# Altium footprint library Connect.PcbLib: 272 footprints (part 10 of 17)
Each footprint in its own frame and in the unit in brackets; x right, y up, seen from the top. Pads: shape width x height; smd on the part's side, far side on the other; paste and mask are expansions set on the pad; w line width, h text height; cw(c..) or ccw(c..) is an arc to the next point about the centre after c.
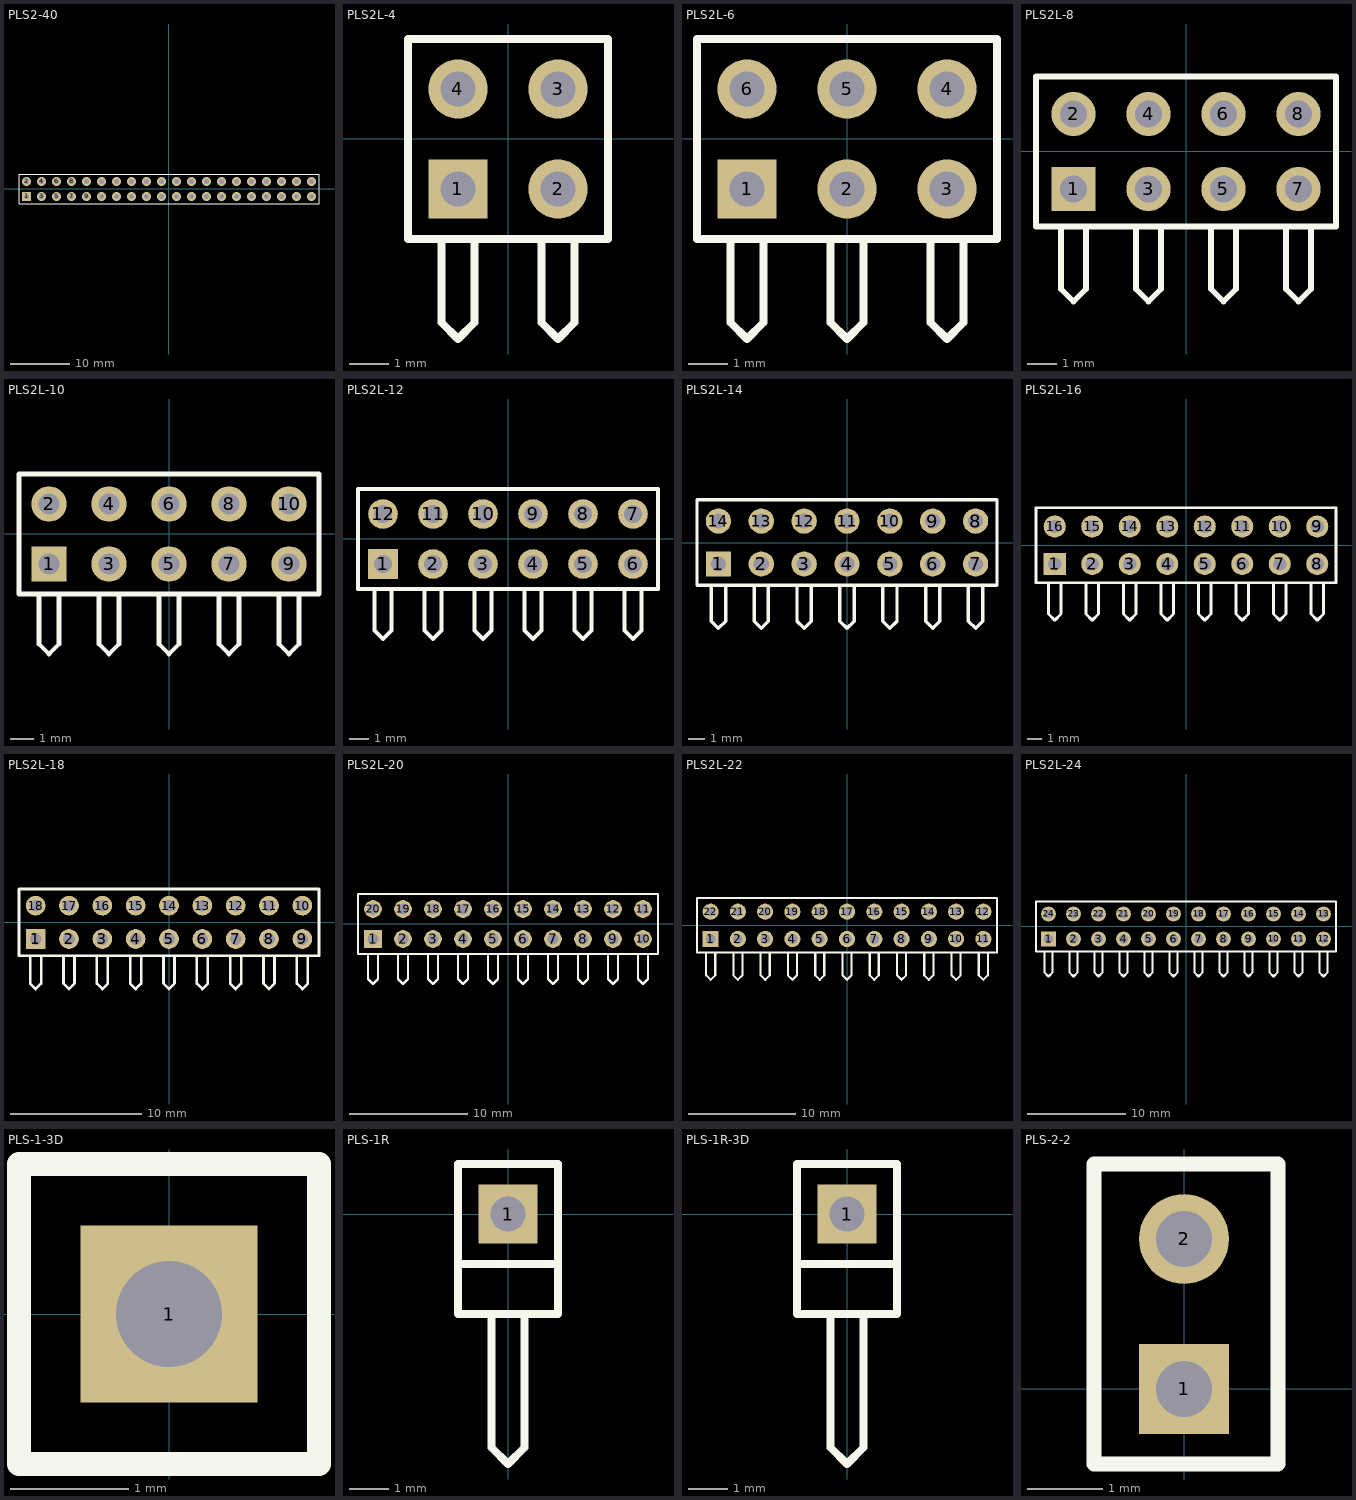
[diagram p9: the footprints below, top view; thin cyan lines are the x and y axes]

## PLS2-40 [mm] "Connector; Header; 40 Position"
height 7.5
pads (40):
  rect 1.5x1.5 hole 0.9: 1(-24.13,-1.27)
  round 1.5 hole 0.9: 2(-24.13,1.27) 3(-21.59,-1.27) 4(-21.59,1.27) 5(-19.05,-1.27) 6(-19.05,1.27) 7(-16.51,-1.27) 8(-16.51,1.27) 9(-13.97,-1.27) 10(-13.97,1.27) 11(-11.43,-1.27) 12(-11.43,1.27) 13(-8.89,-1.27) 14(-8.89,1.27) 15(-6.35,-1.27) 16(-6.35,1.27) 17(-3.81,-1.27) 18(-3.81,1.27) 19(-1.27,-1.27) 20(-1.27,1.27) 21(1.27,-1.27) 22(1.27,1.27) 23(3.81,-1.27) 24(3.81,1.27) 25(6.35,-1.27) 26(6.35,1.27) 27(8.89,-1.27) 28(8.89,1.27) 29(11.43,-1.27) 30(11.43,1.27) 31(13.97,-1.27) 32(13.97,1.27) 33(16.51,-1.27) 34(16.51,1.27) 35(19.05,-1.27) 36(19.05,1.27) 37(21.59,-1.27) 38(21.59,1.27) 39(24.13,-1.27) 40(24.13,1.27)
Top Overlay:
  lines w0.2: -25.4,-2.54 -25.4,2.54 25.4,2.54 25.4,-2.54 -25.4,-2.54
3D body "PLS-1.step": height 8.44, standoff -3, extent 22.86,0 25.4,2.54
3D body "PLS-1.step": height 8.44, standoff -3, extent 22.86,-2.54 25.4,0
3D body "PLS-1.step": height 8.44, standoff -3, extent 20.32,0 22.86,2.54
3D body "PLS-1.step": height 8.44, standoff -3, extent 20.32,-2.54 22.86,0
3D body "PLS-1.step": height 8.44, standoff -3, extent 17.78,-2.54 20.32,0
3D body "PLS-1.step": height 8.44, standoff -3, extent 17.78,0 20.32,2.54
3D body "PLS-1.step": height 8.44, standoff -3, extent 15.24,0 17.78,2.54
3D body "PLS-1.step": height 8.44, standoff -3, extent 15.24,-2.54 17.78,0
3D body "PLS-1.step": height 8.44, standoff -3, extent 12.7,-2.54 15.24,0
3D body "PLS-1.step": height 8.44, standoff -3, extent 12.7,0 15.24,2.54
3D body "PLS-1.step": height 8.44, standoff -3, extent 10.16,0 12.7,2.54
3D body "PLS-1.step": height 8.44, standoff -3, extent 10.16,-2.54 12.7,0
3D body "PLS-1.step": height 8.44, standoff -3, extent 7.62,0 10.16,2.54
3D body "PLS-1.step": height 8.44, standoff -3, extent 7.62,-2.54 10.16,0
3D body "PLS-1.step": height 8.44, standoff -3, extent 5.08,-2.54 7.62,0
3D body "PLS-1.step": height 8.44, standoff -3, extent 5.08,0 7.62,2.54
3D body "PLS-1.step": height 8.44, standoff -3, extent 2.54,0 5.08,2.54
3D body "PLS-1.step": height 8.44, standoff -3, extent 2.54,-2.54 5.08,0
3D body "PLS-1.step": height 8.44, standoff -3, extent 0,-2.54 2.54,0
3D body "PLS-1.step": height 8.44, standoff -3, extent 0,0 2.54,2.54
3D body "PLS-1.step": height 8.44, standoff -3, extent -5.08,-2.54 -2.54,0
3D body "PLS-1.step": height 8.44, standoff -3, extent -5.08,0 -2.54,2.54
3D body "PLS-1.step": height 8.44, standoff -3, extent -10.16,-2.54 -7.62,0
3D body "PLS-1.step": height 8.44, standoff -3, extent -10.16,0 -7.62,2.54
3D body "PLS-1.step": height 8.44, standoff -3, extent -15.24,-2.54 -12.7,0
3D body "PLS-1.step": height 8.44, standoff -3, extent -15.24,0 -12.7,2.54
3D body "PLS-1.step": height 8.44, standoff -3, extent -20.32,-2.54 -17.78,0
3D body "PLS-1.step": height 8.44, standoff -3, extent -20.32,0 -17.78,2.54
3D body "PLS-1.step": height 8.44, standoff -3, extent -22.86,0 -20.32,2.54
3D body "PLS-1.step": height 8.44, standoff -3, extent -25.4,0 -22.86,2.54
3D body "PLS-1.step": height 8.44, standoff -3, extent -22.86,-2.54 -20.32,0
3D body "PLS-1.step": height 8.44, standoff -3, extent -25.4,-2.54 -22.86,0
3D body "PLS-1.step": height 8.44, standoff -3, extent -17.78,0 -15.24,2.54
3D body "PLS-1.step": height 8.44, standoff -3, extent -17.78,-2.54 -15.24,0
3D body "PLS-1.step": height 8.44, standoff -3, extent -12.7,0 -10.16,2.54
3D body "PLS-1.step": height 8.44, standoff -3, extent -12.7,-2.54 -10.16,0
3D body "PLS-1.step": height 8.44, standoff -3, extent -7.62,0 -5.08,2.54
3D body "PLS-1.step": height 8.44, standoff -3, extent -7.62,-2.54 -5.08,0
3D body "PLS-1.step": height 8.44, standoff -3, extent -2.54,0 0,2.54
3D body "PLS-1.step": height 8.44, standoff -3, extent -2.54,-2.54 0,0

## PLS2L-4 [mm]
pads (4):
  rect 1.5x1.5 hole 0.9: 1(-1.27,-1.27)
  round 1.5 hole 0.9: 2(1.27,-1.27) 3(1.27,1.27) 4(-1.27,1.27)
Top Overlay:
  lines w0.2: -1.693,-2.54 -1.693,-4.657 -1.27,-5.08 -0.847,-4.657 -0.847,-2.54 ; 0.847,-2.54 0.847,-4.657 1.27,-5.08 1.693,-4.657 1.693,-2.54 ; -2.54,-2.54 2.54,-2.54 2.54,2.54 -2.54,2.54 -2.54,-2.54
3D body "2.54_horiz_1x2Lpin.STEP": height 4.95, standoff -2.93, extent -2.487,-11.138 -0.013,1.625
3D body "2.54_horiz_1x2Lpin.STEP": height 4.95, standoff -2.93, extent 0.013,-11.138 2.487,1.625

## PLS2L-6 [mm]
pads (6):
  rect 1.5x1.5 hole 0.9: 1(-2.54,-1.27)
  round 1.5 hole 0.9: 2(0,-1.27) 3(2.54,-1.27) 4(2.54,1.27) 5(0,1.27) 6(-2.54,1.27)
Top Overlay:
  lines w0.2: -2.963,-2.54 -2.963,-4.657 -2.54,-5.08 -2.117,-4.657 -2.117,-2.54 ; -0.423,-2.54 -0.423,-4.657 0,-5.08 0.423,-4.657 0.423,-2.54 ; 2.117,-2.54 2.117,-4.657 2.54,-5.08 2.963,-4.657 2.963,-2.54 ; -3.81,-2.54 3.81,-2.54 3.81,2.54 -3.81,2.54 -3.81,-2.54
3D body "2.54_horiz_1x2Lpin.STEP": height 4.95, standoff -2.93, extent 1.288,-11.138 3.762,1.625
3D body "2.54_horiz_1x2Lpin.STEP": height 4.95, standoff -2.93, extent -3.782,-11.138 -1.308,1.625
3D body "2.54_horiz_1x2Lpin.STEP": height 4.95, standoff -2.93, extent -1.232,-11.138 1.242,1.625

## PLS2L-8 [mm]
pads (8):
  rect 1.5x1.5 hole 0.9: 1(-3.81,-1.27)
  round 1.5 hole 0.9: 2(-3.81,1.27) 3(-1.27,-1.27) 4(-1.27,1.27) 5(1.27,-1.27) 6(1.27,1.27) 7(3.81,-1.27) 8(3.81,1.27)
Top Overlay:
  lines w0.2: -4.233,-2.54 -4.233,-4.657 -3.81,-5.08 -3.387,-4.657 -3.387,-2.54 ; -1.693,-2.54 -1.693,-4.657 -1.27,-5.08 -0.847,-4.657 -0.847,-2.54 ; 0.847,-2.54 0.847,-4.657 1.27,-5.08 1.693,-4.657 1.693,-2.54 ; 3.387,-2.54 3.387,-4.657 3.81,-5.08 4.233,-4.657 4.233,-2.54 ; -5.08,-2.54 -5.08,2.54 5.08,2.54 5.08,-2.54 -5.08,-2.54
3D body "2.54_horiz_1x2Lpin.STEP": height 4.95, standoff -2.93, extent -2.502,-11.138 -0.028,1.625
3D body "2.54_horiz_1x2Lpin.STEP": height 4.95, standoff -2.93, extent -5.052,-11.138 -2.578,1.625
3D body "2.54_horiz_1x2Lpin.STEP": height 4.95, standoff -2.93, extent 0.018,-11.138 2.492,1.625
3D body "2.54_horiz_1x2Lpin.STEP": height 4.95, standoff -2.93, extent 2.558,-11.138 5.032,1.625

## PLS2L-10 [mm]
pads (10):
  rect 1.5x1.5 hole 0.9: 1(-5.08,-1.27)
  round 1.5 hole 0.9: 2(-5.08,1.27) 3(-2.54,-1.27) 4(-2.54,1.27) 5(0,-1.27) 6(0,1.27) 7(2.54,-1.27) 8(2.54,1.27) 9(5.08,-1.27) 10(5.08,1.27)
Top Overlay:
  lines w0.2: -5.503,-2.54 -5.503,-4.657 -5.08,-5.08 -4.657,-4.657 -4.657,-2.54 ; -2.963,-2.54 -2.963,-4.657 -2.54,-5.08 -2.117,-4.657 -2.117,-2.54 ; -0.423,-2.54 -0.423,-4.657 0,-5.08 0.423,-4.657 0.423,-2.54 ; 2.117,-2.54 2.117,-4.657 2.54,-5.08 2.963,-4.657 2.963,-2.54 ; 4.657,-2.54 4.657,-4.657 5.08,-5.08 5.503,-4.657 5.503,-2.54 ; -6.35,-2.54 6.35,-2.54 6.35,2.54 -6.35,2.54 -6.35,-2.54
3D body "2.54_horiz_1x2Lpin.STEP": height 4.95, standoff -2.93, extent 3.828,-11.138 6.302,1.625
3D body "2.54_horiz_1x2Lpin.STEP": height 4.95, standoff -2.93, extent 1.288,-11.138 3.762,1.625
3D body "2.54_horiz_1x2Lpin.STEP": height 4.95, standoff -2.93, extent -1.252,-11.138 1.222,1.625
3D body "2.54_horiz_1x2Lpin.STEP": height 4.95, standoff -2.93, extent -6.322,-11.138 -3.848,1.625
3D body "2.54_horiz_1x2Lpin.STEP": height 4.95, standoff -2.93, extent -3.772,-11.138 -1.298,1.625

## PLS2L-12 [mm]
pads (12):
  rect 1.5x1.5 hole 0.9: 1(-6.35,-1.27)
  round 1.5 hole 0.9: 2(-3.81,-1.27) 3(-1.27,-1.27) 4(1.27,-1.27) 5(3.81,-1.27) 6(6.35,-1.27) 7(6.35,1.27) 8(3.81,1.27) 9(1.27,1.27) 10(-1.27,1.27) 11(-3.81,1.27) 12(-6.35,1.27)
Top Overlay:
  lines w0.2: -6.773,-2.54 -6.773,-4.657 -6.35,-5.08 -5.927,-4.657 -5.927,-2.54 ; -4.233,-2.54 -4.233,-4.657 -3.81,-5.08 -3.387,-4.657 -3.387,-2.54 ; -1.693,-2.54 -1.693,-4.657 -1.27,-5.08 -0.847,-4.657 -0.847,-2.54 ; 0.847,-2.54 0.847,-4.657 1.27,-5.08 1.693,-4.657 1.693,-2.54 ; 3.387,-2.54 3.387,-4.657 3.81,-5.08 4.233,-4.657 4.233,-2.54 ; 5.927,-2.54 5.927,-4.657 6.35,-5.08 6.773,-4.657 6.773,-2.54 ; -7.62,-2.54 -7.62,2.54 7.62,2.54 7.62,-2.54 -7.62,-2.54
3D body "2.54_horiz_1x2Lpin.STEP": height 4.95, standoff -2.93, extent 5.098,-11.138 7.572,1.625
3D body "2.54_horiz_1x2Lpin.STEP": height 4.95, standoff -2.93, extent -5.042,-11.138 -2.568,1.625
3D body "2.54_horiz_1x2Lpin.STEP": height 4.95, standoff -2.93, extent -7.592,-11.138 -5.118,1.625
3D body "2.54_horiz_1x2Lpin.STEP": height 4.95, standoff -2.93, extent -2.522,-11.138 -0.048,1.625
3D body "2.54_horiz_1x2Lpin.STEP": height 4.95, standoff -2.93, extent 0.018,-11.138 2.492,1.625
3D body "2.54_horiz_1x2Lpin.STEP": height 4.95, standoff -2.93, extent 2.558,-11.138 5.032,1.625

## PLS2L-14 [mm]
pads (14):
  rect 1.5x1.5 hole 0.9: 1(-7.62,-1.27)
  round 1.5 hole 0.9: 2(-5.08,-1.27) 3(-2.54,-1.27) 4(0,-1.27) 5(2.54,-1.27) 6(5.08,-1.27) 7(7.62,-1.27) 8(7.62,1.27) 9(5.08,1.27) 10(2.54,1.27) 11(0,1.27) 12(-2.54,1.27) 13(-5.08,1.27) 14(-7.62,1.27)
Top Overlay:
  lines w0.2: -8.043,-2.54 -8.043,-4.657 -7.62,-5.08 -7.197,-4.657 -7.197,-2.54 ; -5.503,-2.54 -5.503,-4.657 -5.08,-5.08 -4.657,-4.657 -4.657,-2.54 ; -2.963,-2.54 -2.963,-4.657 -2.54,-5.08 -2.117,-4.657 -2.117,-2.54 ; -0.423,-2.54 -0.423,-4.657 0,-5.08 0.423,-4.657 0.423,-2.54 ; 2.117,-2.54 2.117,-4.657 2.54,-5.08 2.963,-4.657 2.963,-2.54 ; 4.657,-2.54 4.657,-4.657 5.08,-5.08 5.503,-4.657 5.503,-2.54 ; 7.197,-2.54 7.197,-4.657 7.62,-5.08 8.043,-4.657 8.043,-2.54 ; -8.89,-2.54 -8.89,2.54 8.89,2.54 8.89,-2.54 -8.89,-2.54
3D body "2.54_horiz_1x2Lpin.STEP": height 4.95, standoff -2.93, extent 3.828,-11.138 6.302,1.625
3D body "2.54_horiz_1x2Lpin.STEP": height 4.95, standoff -2.93, extent -6.312,-11.138 -3.838,1.625
3D body "2.54_horiz_1x2Lpin.STEP": height 4.95, standoff -2.93, extent -8.862,-11.138 -6.388,1.625
3D body "2.54_horiz_1x2Lpin.STEP": height 4.95, standoff -2.93, extent -3.792,-11.138 -1.318,1.625
3D body "2.54_horiz_1x2Lpin.STEP": height 4.95, standoff -2.93, extent -1.252,-11.138 1.222,1.625
3D body "2.54_horiz_1x2Lpin.STEP": height 4.95, standoff -2.93, extent 1.288,-11.138 3.762,1.625
3D body "2.54_horiz_1x2Lpin.STEP": height 4.95, standoff -2.93, extent 6.368,-11.138 8.842,1.625

## PLS2L-16 [mm]
pads (16):
  rect 1.5x1.5 hole 0.9: 1(-8.89,-1.27)
  round 1.5 hole 0.9: 2(-6.35,-1.27) 3(-3.81,-1.27) 4(-1.27,-1.27) 5(1.27,-1.27) 6(3.81,-1.27) 7(6.35,-1.27) 8(8.89,-1.27) 9(8.89,1.27) 10(6.35,1.27) 11(3.81,1.27) 12(1.27,1.27) 13(-1.27,1.27) 14(-3.81,1.27) 15(-6.35,1.27) 16(-8.89,1.27)
Top Overlay:
  lines w0.2: -9.313,-2.54 -9.313,-4.657 -8.89,-5.08 -8.467,-4.657 -8.467,-2.54 ; -6.773,-2.54 -6.773,-4.657 -6.35,-5.08 -5.927,-4.657 -5.927,-2.54 ; -4.233,-2.54 -4.233,-4.657 -3.81,-5.08 -3.387,-4.657 -3.387,-2.54 ; -1.693,-2.54 -1.693,-4.657 -1.27,-5.08 -0.847,-4.657 -0.847,-2.54 ; 0.847,-2.54 0.847,-4.657 1.27,-5.08 1.693,-4.657 1.693,-2.54 ; 3.387,-2.54 3.387,-4.657 3.81,-5.08 4.233,-4.657 4.233,-2.54 ; 5.927,-2.54 5.927,-4.657 6.35,-5.08 6.773,-4.657 6.773,-2.54 ; 8.467,-2.54 8.467,-4.657 8.89,-5.08 9.313,-4.657 9.313,-2.54 ; -10.16,-2.54 10.16,-2.54 10.16,2.54 -10.16,2.54 -10.16,-2.54
3D body "2.54_horiz_1x2Lpin.STEP": height 4.95, standoff -2.93, extent 5.098,-11.138 7.572,1.625
3D body "2.54_horiz_1x2Lpin.STEP": height 4.95, standoff -2.93, extent 0.018,-11.138 2.492,1.625
3D body "2.54_horiz_1x2Lpin.STEP": height 4.95, standoff -2.93, extent -2.522,-11.138 -0.048,1.625
3D body "2.54_horiz_1x2Lpin.STEP": height 4.95, standoff -2.93, extent -5.062,-11.138 -2.588,1.625
3D body "2.54_horiz_1x2Lpin.STEP": height 4.95, standoff -2.93, extent -10.132,-11.138 -7.658,1.625
3D body "2.54_horiz_1x2Lpin.STEP": height 4.95, standoff -2.93, extent -7.582,-11.138 -5.108,1.625
3D body "2.54_horiz_1x2Lpin.STEP": height 4.95, standoff -2.93, extent 2.558,-11.138 5.032,1.625
3D body "2.54_horiz_1x2Lpin.STEP": height 4.95, standoff -2.93, extent 7.638,-11.138 10.112,1.625

## PLS2L-18 [mm]
pads (18):
  rect 1.5x1.5 hole 0.9: 1(-10.16,-1.27)
  round 1.5 hole 0.9: 2(-7.62,-1.27) 3(-5.08,-1.27) 4(-2.54,-1.27) 5(0,-1.27) 6(2.54,-1.27) 7(5.08,-1.27) 8(7.62,-1.27) 9(10.16,-1.27) 10(10.16,1.27) 11(7.62,1.27) 12(5.08,1.27) 13(2.54,1.27) 14(0,1.27) 15(-2.54,1.27) 16(-5.08,1.27) 17(-7.62,1.27) 18(-10.16,1.27)
Top Overlay:
  lines w0.2: -10.583,-2.54 -10.583,-4.657 -10.16,-5.08 -9.737,-4.657 -9.737,-2.54 ; -8.043,-2.54 -8.043,-4.657 -7.62,-5.08 -7.197,-4.657 -7.197,-2.54 ; -5.503,-2.54 -5.503,-4.657 -5.08,-5.08 -4.657,-4.657 -4.657,-2.54 ; -2.963,-2.54 -2.963,-4.657 -2.54,-5.08 -2.117,-4.657 -2.117,-2.54 ; -0.423,-2.54 -0.423,-4.657 0,-5.08 0.423,-4.657 0.423,-2.54 ; 2.117,-2.54 2.117,-4.657 2.54,-5.08 2.963,-4.657 2.963,-2.54 ; 4.657,-2.54 4.657,-4.657 5.08,-5.08 5.503,-4.657 5.503,-2.54 ; 7.197,-2.54 7.197,-4.657 7.62,-5.08 8.043,-4.657 8.043,-2.54 ; 9.737,-2.54 9.737,-4.657 10.16,-5.08 10.583,-4.657 10.583,-2.54 ; -11.43,-2.54 11.43,-2.54 11.43,2.54 -11.43,2.54 -11.43,-2.54
3D body "2.54_horiz_1x2Lpin.STEP": height 4.95, standoff -2.93, extent 3.828,-11.138 6.302,1.625
3D body "2.54_horiz_1x2Lpin.STEP": height 4.95, standoff -2.93, extent -1.252,-11.138 1.222,1.625
3D body "2.54_horiz_1x2Lpin.STEP": height 4.95, standoff -2.93, extent -3.792,-11.138 -1.318,1.625
3D body "2.54_horiz_1x2Lpin.STEP": height 4.95, standoff -2.93, extent -6.332,-11.138 -3.858,1.625
3D body "2.54_horiz_1x2Lpin.STEP": height 4.95, standoff -2.93, extent -11.402,-11.138 -8.928,1.625
3D body "2.54_horiz_1x2Lpin.STEP": height 4.95, standoff -2.93, extent -8.852,-11.138 -6.378,1.625
3D body "2.54_horiz_1x2Lpin.STEP": height 4.95, standoff -2.93, extent 1.288,-11.138 3.762,1.625
3D body "2.54_horiz_1x2Lpin.STEP": height 4.95, standoff -2.93, extent 6.368,-11.138 8.842,1.625
3D body "2.54_horiz_1x2Lpin.STEP": height 4.95, standoff -2.93, extent 8.908,-11.138 11.382,1.625

## PLS2L-20 [mm]
pads (20):
  rect 1.5x1.5 hole 0.9: 1(-11.43,-1.27)
  round 1.5 hole 0.9: 2(-8.89,-1.27) 3(-6.35,-1.27) 4(-3.81,-1.27) 5(-1.27,-1.27) 6(1.27,-1.27) 7(3.81,-1.27) 8(6.35,-1.27) 9(8.89,-1.27) 10(11.43,-1.27) 11(11.43,1.27) 12(8.89,1.27) 13(6.35,1.27) 14(3.81,1.27) 15(1.27,1.27) 16(-1.27,1.27) 17(-3.81,1.27) 18(-6.35,1.27) 19(-8.89,1.27) 20(-11.43,1.27)
Top Overlay:
  lines w0.2: -11.853,-2.54 -11.853,-4.657 -11.43,-5.08 -11.007,-4.657 -11.007,-2.54 ; -9.313,-2.54 -9.313,-4.657 -8.89,-5.08 -8.467,-4.657 -8.467,-2.54 ; -6.773,-2.54 -6.773,-4.657 -6.35,-5.08 -5.927,-4.657 -5.927,-2.54 ; -4.233,-2.54 -4.233,-4.657 -3.81,-5.08 -3.387,-4.657 -3.387,-2.54 ; -1.693,-2.54 -1.693,-4.657 -1.27,-5.08 -0.847,-4.657 -0.847,-2.54 ; 0.847,-2.54 0.847,-4.657 1.27,-5.08 1.693,-4.657 1.693,-2.54 ; 3.387,-2.54 3.387,-4.657 3.81,-5.08 4.233,-4.657 4.233,-2.54 ; 5.927,-2.54 5.927,-4.657 6.35,-5.08 6.773,-4.657 6.773,-2.54 ; 8.467,-2.54 8.467,-4.657 8.89,-5.08 9.313,-4.657 9.313,-2.54 ; 11.007,-2.54 11.007,-4.657 11.43,-5.08 11.853,-4.657 11.853,-2.54 ; -12.7,-2.54 12.7,-2.54 12.7,2.54 -12.7,2.54 -12.7,-2.54
3D body "2.54_horiz_1x2Lpin.STEP": height 4.95, standoff -2.93, extent 10.178,-11.138 12.652,1.625
3D body "2.54_horiz_1x2Lpin.STEP": height 4.95, standoff -2.93, extent 2.558,-11.138 5.032,1.625
3D body "2.54_horiz_1x2Lpin.STEP": height 4.95, standoff -2.93, extent -2.522,-11.138 -0.048,1.625
3D body "2.54_horiz_1x2Lpin.STEP": height 4.95, standoff -2.93, extent -5.062,-11.138 -2.588,1.625
3D body "2.54_horiz_1x2Lpin.STEP": height 4.95, standoff -2.93, extent -7.602,-11.138 -5.128,1.625
3D body "2.54_horiz_1x2Lpin.STEP": height 4.95, standoff -2.93, extent -12.672,-11.138 -10.198,1.625
3D body "2.54_horiz_1x2Lpin.STEP": height 4.95, standoff -2.93, extent -10.122,-11.138 -7.648,1.625
3D body "2.54_horiz_1x2Lpin.STEP": height 4.95, standoff -2.93, extent 0.018,-11.138 2.492,1.625
3D body "2.54_horiz_1x2Lpin.STEP": height 4.95, standoff -2.93, extent 5.098,-11.138 7.572,1.625
3D body "2.54_horiz_1x2Lpin.STEP": height 4.95, standoff -2.93, extent 7.638,-11.138 10.112,1.625

## PLS2L-22 [mm]
pads (22):
  rect 1.5x1.5 hole 0.9: 1(-12.7,-1.27)
  round 1.5 hole 0.9: 2(-10.16,-1.27) 3(-7.62,-1.27) 4(-5.08,-1.27) 5(-2.54,-1.27) 6(0,-1.27) 7(2.54,-1.27) 8(5.08,-1.27) 9(7.62,-1.27) 10(10.16,-1.27) 11(12.7,-1.27) 12(12.7,1.27) 13(10.16,1.27) 14(7.62,1.27) 15(5.08,1.27) 16(2.54,1.27) 17(0,1.27) 18(-2.54,1.27) 19(-5.08,1.27) 20(-7.62,1.27) 21(-10.16,1.27) 22(-12.7,1.27)
Top Overlay:
  lines w0.2: -13.123,-2.54 -13.123,-4.657 -12.7,-5.08 -12.277,-4.657 -12.277,-2.54 ; -10.583,-2.54 -10.583,-4.657 -10.16,-5.08 -9.737,-4.657 -9.737,-2.54 ; -8.043,-2.54 -8.043,-4.657 -7.62,-5.08 -7.197,-4.657 -7.197,-2.54 ; -5.503,-2.54 -5.503,-4.657 -5.08,-5.08 -4.657,-4.657 -4.657,-2.54 ; -2.963,-2.54 -2.963,-4.657 -2.54,-5.08 -2.117,-4.657 -2.117,-2.54 ; -0.423,-2.54 -0.423,-4.657 0,-5.08 0.423,-4.657 0.423,-2.54 ; 2.117,-2.54 2.117,-4.657 2.54,-5.08 2.963,-4.657 2.963,-2.54 ; 4.657,-2.54 4.657,-4.657 5.08,-5.08 5.503,-4.657 5.503,-2.54 ; 7.197,-2.54 7.197,-4.657 7.62,-5.08 8.043,-4.657 8.043,-2.54 ; 9.737,-2.54 9.737,-4.657 10.16,-5.08 10.583,-4.657 10.583,-2.54 ; 12.277,-2.54 12.277,-4.657 12.7,-5.08 13.123,-4.657 13.123,-2.54 ; -13.97,-2.54 -13.97,2.54 13.97,2.54 13.97,-2.54 -13.97,-2.54
3D body "2.54_horiz_1x2Lpin.STEP": height 4.95, standoff -2.93, extent 11.448,-11.138 13.922,1.625
3D body "2.54_horiz_1x2Lpin.STEP": height 4.95, standoff -2.93, extent 6.368,-11.138 8.842,1.625
3D body "2.54_horiz_1x2Lpin.STEP": height 4.95, standoff -2.93, extent 3.828,-11.138 6.302,1.625
3D body "2.54_horiz_1x2Lpin.STEP": height 4.95, standoff -2.93, extent -1.252,-11.138 1.222,1.625
3D body "2.54_horiz_1x2Lpin.STEP": height 4.95, standoff -2.93, extent -11.392,-11.138 -8.918,1.625
3D body "2.54_horiz_1x2Lpin.STEP": height 4.95, standoff -2.93, extent -13.942,-11.138 -11.468,1.625
3D body "2.54_horiz_1x2Lpin.STEP": height 4.95, standoff -2.93, extent -8.872,-11.138 -6.398,1.625
3D body "2.54_horiz_1x2Lpin.STEP": height 4.95, standoff -2.93, extent -6.332,-11.138 -3.858,1.625
3D body "2.54_horiz_1x2Lpin.STEP": height 4.95, standoff -2.93, extent -3.792,-11.138 -1.318,1.625
3D body "2.54_horiz_1x2Lpin.STEP": height 4.95, standoff -2.93, extent 1.288,-11.138 3.762,1.625
3D body "2.54_horiz_1x2Lpin.STEP": height 4.95, standoff -2.93, extent 8.908,-11.138 11.382,1.625

## PLS2L-24 [mm]
pads (24):
  rect 1.5x1.5 hole 0.9: 1(-13.97,-1.27)
  round 1.5 hole 0.9: 2(-11.43,-1.27) 3(-8.89,-1.27) 4(-6.35,-1.27) 5(-3.81,-1.27) 6(-1.27,-1.27) 7(1.27,-1.27) 8(3.81,-1.27) 9(6.35,-1.27) 10(8.89,-1.27) 11(11.43,-1.27) 12(13.97,-1.27) 13(13.97,1.27) 14(11.43,1.27) 15(8.89,1.27) 16(6.35,1.27) 17(3.81,1.27) 18(1.27,1.27) 19(-1.27,1.27) 20(-3.81,1.27) 21(-6.35,1.27) 22(-8.89,1.27) 23(-11.43,1.27) 24(-13.97,1.27)
Top Overlay:
  lines w0.2: -14.393,-2.54 -14.393,-4.657 -13.97,-5.08 -13.547,-4.657 -13.547,-2.54 ; -11.853,-2.54 -11.853,-4.657 -11.43,-5.08 -11.007,-4.657 -11.007,-2.54 ; -9.313,-2.54 -9.313,-4.657 -8.89,-5.08 -8.467,-4.657 -8.467,-2.54 ; -6.773,-2.54 -6.773,-4.657 -6.35,-5.08 -5.927,-4.657 -5.927,-2.54 ; -4.233,-2.54 -4.233,-4.657 -3.81,-5.08 -3.387,-4.657 -3.387,-2.54 ; -1.693,-2.54 -1.693,-4.657 -1.27,-5.08 -0.847,-4.657 -0.847,-2.54 ; 0.847,-2.54 0.847,-4.657 1.27,-5.08 1.693,-4.657 1.693,-2.54 ; 3.387,-2.54 3.387,-4.657 3.81,-5.08 4.233,-4.657 4.233,-2.54 ; 5.927,-2.54 5.927,-4.657 6.35,-5.08 6.773,-4.657 6.773,-2.54 ; 8.467,-2.54 8.467,-4.657 8.89,-5.08 9.313,-4.657 9.313,-2.54 ; 11.007,-2.54 11.007,-4.657 11.43,-5.08 11.853,-4.657 11.853,-2.54 ; 13.547,-2.54 13.547,-4.657 13.97,-5.08 14.393,-4.657 14.393,-2.54 ; 15.23,-2.54 -15.24,-2.54 -15.24,2.54 15.23,2.54 ; 15.24,-2.54 15.24,2.54
3D body "2.54_horiz_1x2Lpin.STEP": height 4.95, standoff -2.93, extent 12.718,-11.138 15.192,1.625
3D body "2.54_horiz_1x2Lpin.STEP": height 4.95, standoff -2.93, extent 10.178,-11.138 12.652,1.625
3D body "2.54_horiz_1x2Lpin.STEP": height 4.95, standoff -2.93, extent 5.098,-11.138 7.572,1.625
3D body "2.54_horiz_1x2Lpin.STEP": height 4.95, standoff -2.93, extent 2.558,-11.138 5.032,1.625
3D body "2.54_horiz_1x2Lpin.STEP": height 4.95, standoff -2.93, extent -2.522,-11.138 -0.048,1.625
3D body "2.54_horiz_1x2Lpin.STEP": height 4.95, standoff -2.93, extent -12.662,-11.138 -10.188,1.625
3D body "2.54_horiz_1x2Lpin.STEP": height 4.95, standoff -2.93, extent -15.212,-11.138 -12.738,1.625
3D body "2.54_horiz_1x2Lpin.STEP": height 4.95, standoff -2.93, extent -10.142,-11.138 -7.668,1.625
3D body "2.54_horiz_1x2Lpin.STEP": height 4.95, standoff -2.93, extent -7.602,-11.138 -5.128,1.625
3D body "2.54_horiz_1x2Lpin.STEP": height 4.95, standoff -2.93, extent -5.062,-11.138 -2.588,1.625
3D body "2.54_horiz_1x2Lpin.STEP": height 4.95, standoff -2.93, extent 0.018,-11.138 2.492,1.625
3D body "2.54_horiz_1x2Lpin.STEP": height 4.95, standoff -2.93, extent 7.638,-11.138 10.112,1.625

## PLS-1-3D [mm] "Connector; Header; 1 Position"
height 7.5
pads (1):
  rect 1.5x1.5 hole 0.9: 1(0,0)
Top Overlay:
  lines w0.2: -1.27,-1.27 1.27,-1.27 1.27,1.27 -1.27,1.27 -1.27,-1.27
3D body "PLS-1.step": height 8.44, standoff -3, extent -1.27,-1.27 1.27,1.27

## PLS-1R [mm] "Connector; Header; 1 Position; Right Angle"
height 0.001
pads (1):
  rect 1.5x1.5 hole 0.9: 1(0,0)
Top Overlay:
  lines w0.2: -0.423,-2.54 -0.423,-5.927 0,-6.35 0.423,-5.927 0.423,-2.54 ; -1.27,-1.27 -1.27,1.27 1.27,1.27 1.27,-1.27 ; -1.27,-1.27 -1.27,-2.54 1.27,-2.54 1.27,-1.27 ; -1.27,-1.27 1.27,-1.27

## PLS-1R-3D [mm] "Connector; Header; 1 Position; Right Angle"
height 12
pads (1):
  rect 1.5x1.5 hole 0.9: 1(0,0)
Top Overlay:
  lines w0.2: -0.423,-2.54 -0.423,-5.927 0,-6.35 0.423,-5.927 0.423,-2.54 ; -1.27,-1.27 -1.27,1.27 1.27,1.27 1.27,-1.27 ; -1.27,-1.27 -1.27,-2.54 1.27,-2.54 1.27,-1.27 ; -1.27,-1.27 1.27,-1.27
3D body "2.54_1pin.STEP": height 2.77, standoff -2.77, extent -1.27,-10.045 1.27,0.315

## PLS-2-2 [mm] "Connector; Header; 1x2 Position"
height 6
pads (2):
  rect 1.2x1.2 hole 0.75: 1(0,0)
  round 1.2 hole 0.75: 2(0,2)
Top Overlay:
  lines w0.2: -1.2,-1 -1.2,3 1.25,3 1.25,-1 -1.2,-1